# Altium footprint library PcbLib1.PcbLib: 56 footprints (part 2 of 4)
Each footprint in its own frame and in the unit in brackets; x right, y up, seen from the top. Pads: shape width x height; smd on the part's side, far side on the other; paste and mask are expansions set on the pad; w line width, h text height; cw(c..) or ccw(c..) is an arc to the next point about the centre after c.
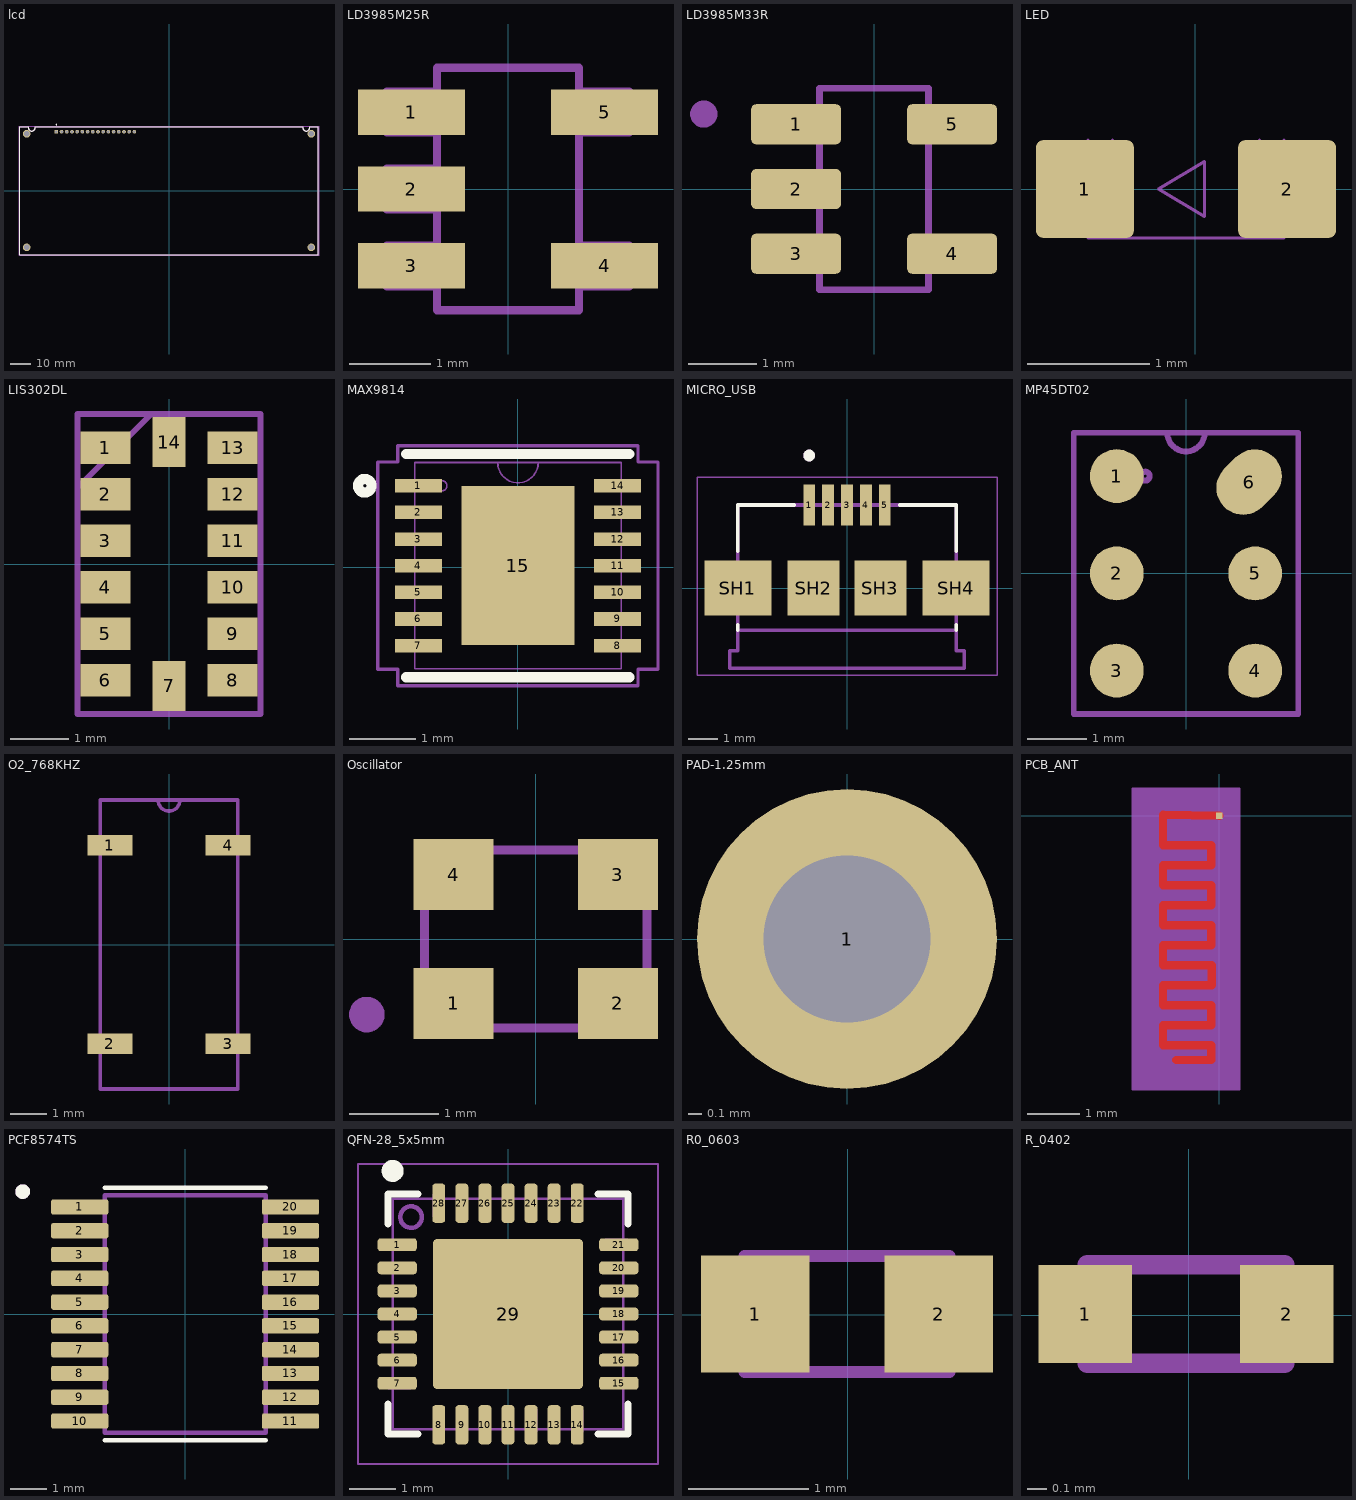
[diagram p1: the footprints below, top view; thin cyan lines are the x and y axes]

## lcd [mm]
pads (20):
  rect 1.8x1.8 / inner round 1.8 / far side rect 1.8x1.8 hole 1.2: 1(-55,28.75)
  round 1.8 hole 1.2: 2(-52.46,28.75) 3(-49.92,28.75) 4(-47.38,28.75) 5(-44.84,28.75) 6(-42.3,28.75) 7(-39.76,28.75) 8(-37.22,28.75) 9(-34.68,28.75) 10(-32.14,28.75) 11(-29.6,28.75) 12(-27.06,28.75) 13(-24.52,28.75) 14(-21.98,28.75) 15(-19.44,28.75) 16(-16.9,28.75)
  round 3.716 hole 2.7: SH1(-69.5,27.75) SH2(69.5,27.75) SH3(-69.5,-27.75) SH4(69.5,-27.75)
Top Overlay:
  circle w0.2: c-55,32.179 r0.1
  lines w0.127: -68.751,31.246 ccw(c-66.75,31) -66.996,28.999 ; -68.75,31.25 -73,31.25 -73,-31.25 73,-31.25 73,31.25 68.75,31.25 ; -67.004,28.999 ccw(c-67.25,31) -65.249,31.246 ; -65.25,31.25 65.25,31.25 ; 65.249,31.246 ccw(c67.25,31) 67.004,28.999 ; 66.996,28.999 ccw(c66.75,31) 68.751,31.246
Mechanical 13:
  circle w0.2: c-55,32.179 r0.1
  lines w0.127: -68.751,31.246 ccw(c-66.75,31) -66.996,28.999 ; -68.75,31.25 -73,31.25 -73,-31.25 73,-31.25 73,31.25 68.75,31.25 ; -67.004,28.999 ccw(c-67.25,31) -65.249,31.246 ; -65.25,31.25 65.25,31.25 ; 65.249,31.246 ccw(c67.25,31) 67.004,28.999 ; 66.996,28.999 ccw(c66.75,31) 68.751,31.246
Mechanical 15:
  lines w0.05: -73.25,-31.5 -73.25,31.5 73.25,31.5 73.25,-31.5 -73.25,-31.5
3D body "step_temp.STEP": height 26.3, standoff 11.8, extent -73,-31.25 73,31.25

## LD3985M25R [mil]
pads (5):
  rect 52x22 smd paste+0 mask+0: 1(-47,37.4) 2(-47,0) 3(-47,-37.4) 4(47,-37.4) 5(47,37.4)
Top Assembly:
  lines w3.94: -59,-47.4 -34.5,-47.4 -34.5,-27.4 -59,-27.4 -59,-47.4 ; -59,-10 -34.5,-10 -34.5,10 -59,10 -59,-10 ; -59,27.4 -34.5,27.4 -34.5,47.4 -59,47.4 -59,27.4 ; -34.5,-59 -34.5,59 34.5,59 34.5,-59 -34.5,-59 ; 34.5,-47.4 59,-47.4 59,-27.4 34.5,-27.4 34.5,-47.4 ; 34.5,27.4 59,27.4 59,47.4 34.5,47.4 34.5,27.4
Mechanical 13:
  text "*" at -37,18.4 h50
3D body "SOT23-5L_STM.step": height 57.09, standoff 0, extent -59.01,-59.01 59.02,59.02

## LD3985M33R [mm]
pads (5):
  rrect25% 1.32x0.59 smd: 1(-1.145,0.95) 2(-1.145,0) 3(-1.145,-0.95) 4(1.145,-0.95) 5(1.145,0.95)
Top Assembly:
  lines w0.1: -0.8,-1.48 -0.8,1.48 0.8,1.48 0.8,-1.48 -0.8,-1.48
Mechanical 13:
  circle w0.2: c-2.5,1.1 r0.1
3D body "step_temp.STEP": height 1.45, standoff 0, extent -1.4,-1.462 1.4,1.463

## LED [mm]
pads (2):
  rrect15% 0.8x0.8 smd mask+0.05: 1(-0.9,0) 2(0.75,0)
Top Component Center:
  lines w0.025: -0.875,-0.25 -0.675,-0.25 ; -0.875,0.25 -0.675,0.25 ; -0.875,0.4 -0.875,0.15 cw(c-0.875,0) -0.875,-0.15 -0.875,-0.4 0.725,-0.4 0.725,-0.15 cw(c0.725,0) 0.725,0.15 0.725,0.4 ; -0.675,-0.4 -0.675,0.4 ; 0.525,-0.4 0.525,0.4 ; 0.525,-0.15 ccw(c0.725,0) 0.725,-0.25 ; 0.525,0.15 cw(c0.725,0) 0.725,0.25 ; -0.3,0 0.075,0.225 0.075,-0.225 -0.3,0
3D body "SML-D10.STEP": height 0.54, standoff -0.01, extent -0.875,-0.4 0.725,0.4

## LIS302DL [mil]
pads (14):
  rect 34x22 smd paste+0 mask+0: 1(-43,78.74) 2(-43,47.24) 3(-43,15.75) 4(-43,-15.75) 5(-43,-47.24) 6(-43,-78.74) 8(43,-78.74) 9(43,-47.24) 10(43,-15.75) 11(43,15.75) 12(43,47.24) 13(43,78.74)
  rect 22x34 smd paste+0 mask+0: 7(0,-82.5) 14(0,82.5)
Top Assembly:
  lines w3.94: -62,51.5 -12,101.5 ; -62,-101.5 62,-101.5 62,101.5 -62,101.5 -62,-101.5
Mechanical 13:
  text "*" at -38.5,84.49 h50
3D body "LGA-14_3x5x0p92mm_STM.step": height 39.09, standoff 0, extent -62,-101.49 62.01,101.5

## MAX9814 [mm]
pads (15):
  rect 0.706x0.204 smd paste+0 mask+0: 1(-1.496,1.225) 2(-1.496,0.825) 3(-1.496,0.425) 4(-1.496,0.025) 5(-1.496,-0.375) 6(-1.496,-0.775) 7(-1.496,-1.175) 8(1.496,-1.175) 9(1.496,-0.775) 10(1.496,-0.375) 11(1.496,0.025) 12(1.496,0.425) 13(1.496,0.825) 14(1.496,1.225)
  rect 1.702x2.388 smd paste+0 mask+0: 15(0,0.025)
Top Overlay:
  circle w0.152: c-2.3,1.225 r0.102
  lines w0.152: -1.676,-1.651 1.676,-1.651 ; -1.676,1.701 1.676,1.701
Top Assembly:
  lines w0.05: -2.103,-1.531 -2.103,1.581 -1.803,1.581 -1.803,1.828 1.803,1.828 1.803,1.581 2.103,1.581 2.103,-1.531 1.803,-1.531 1.803,-1.778 -1.803,-1.778 -1.803,-1.531 -2.103,-1.531
Mechanical 13:
  circle w0.025: c-1.143,1.225 r0.076
  lines w0.025: -0.305,1.574 ccw(c0,1.574) 0.305,1.574 ; -1.549,-1.524 -1.549,1.574 1.549,1.574 1.549,-1.524 -1.549,-1.524
3D body "21-0137I_T1433-2_MXM.step": height 0.81, standoff 0, extent -1.549,-1.524 1.549,1.574

## MICRO_USB [mm]
pads (9):
  rect 0.4x1.4 smd: 1(-1.3,2.85) 2(-0.65,2.85) 3(0,2.85) 4(0.65,2.85) 5(1.3,2.85)
  rect 2.3x1.9 smd: SH1(-3.75,0) SH4(3.75,0)
  rect 1.8x1.9 smd: SH2(-1.15,0) SH3(1.15,0)
Top Overlay:
  circle w0.2: c-1.3,4.55 r0.1
  lines w0.127: -3.75,-1.45 -3.75,-1.27 ; -3.75,1.27 -3.75,2.85 -1.82,2.85 ; 1.82,2.85 3.75,2.85 3.75,1.27 ; 3.75,-1.45 3.75,-1.27
Top Assembly:
  lines w0.05: -5.15,-3 -5.15,3.8 5.15,3.8 5.15,-3 -5.15,-3
Mechanical 13:
  circle w0.2: c-1.3,4.55 r0.1
  lines w0.127: -3.75,-1.45 3.75,-1.45 ; -3.75,-1.45 -3.75,-2.15 -4.03,-2.15 -4.03,-2.75 4.03,-2.75 4.03,-2.15 3.75,-2.15 3.75,-1.45 ; -3.75,-1.45 -3.75,2.85 3.75,2.85 3.75,-1.45
3D body "step_temp.STEP": height 2.79, standoff -0.24, extent -4.039,-2.705 4.039,2.859

## MP45DT02 [mil]
pads (6):
  round 36 smd paste+0 mask+0: 1(-46.26,64.96) 2(-46.26,0) 3(-46.26,-64.96) 4(46.26,-64.96) 5(46.26,0)
  oval 47x36 smd rot 45 paste-23.5 mask-23.5: 6(42.13,61.02)
Top Assembly:
  circle w3.94: c-27.26,64.96 r3
  lines w3.94: -12.5,94 ccw(c0,94) 12.5,94 ; -75,-94 75,-94 75,94 -75,94 -75,-94
3D body "MP45DT02.STEP": height 54.13, standoff 0, extent -74.01,-92.91 74.02,92.92

## O2_768KHZ [mil]
pads (4):
  rect 49x22 smd paste+0 mask+0: 1(-64.5,108.27) 2(-64.5,-108.27) 3(64.5,-108.27) 4(64.5,108.27)
Top Assembly:
  lines w3.94: -12,157.5 ccw(c0,157.5) 12,157.5 ; -75,-157.5 -75,157.5 75,157.5 75,-157.5 -75,-157.5 ; -75,-118.27 -75,-98.27 -75,-118.27 ; -75,98.27 -75,118.27 -75,98.27 ; 75,-118.27 75,-98.27 75,-118.27 ; 75,98.27 75,118.27 75,98.27
Mechanical 13:
  text "*" at -57,80.27 h50
3D body "X_ABS25_ABR.step": height 98.11, standoff -0.02, extent -75,-157.48 75,157.48

## Oscillator [mm]
pads (4):
  rect 0.9x0.8 smd: 1(-0.925,-0.725) 2(0.925,-0.725) 3(0.925,0.725) 4(-0.925,0.725)
Top Assembly:
  lines w0.1: -1.25,-1 -1.25,1 1.25,1 1.25,-1 -1.25,-1
Mechanical 13:
  circle w0.2: c-1.9,-0.85 r0.1
3D body "step_temp.STEP": height 0.9, standoff 0, extent -1.25,-1 1.25,1

## PAD-1.25mm [mm]
pads (1):
  round 2.25 hole 1.25: 1(0,0)

## PCB_ANT [mil]
pads (1):
  rect 5x5 smd: 1(0,0)
Top Layer:
  lines w6.2: -32.23,-183.23 -6,-183.23 -6,-172.27 -42.23,-172.27 -42.23,-157.27 -6,-157.27 -6,-142.27 -42.23,-142.27 -42.23,-127.27 -5.64,-127.27 -5.64,-112.27 -42.23,-112.27 -42.23,-97.27 -6,-97.27 -6,-82.27 -42.23,-82.27 -42.23,-67.27 -6,-67.27 -6,-52.27 -42.23,-52.27 -42.23,-37.27 -6,-37.27 -6,-22.27 -42.23,-22.27 -42.23,0.73 0,0
Mechanical 1:
  pour cut-out: -65,20 -65,-205 15,-205 15,20
Top Assembly:
  lines w1.97: -65,-205 15,-205 15,20 -65,20 -65,-205
Top Designator:
  text ".Designator" at -92.83,56.68 h19.68
Top Value:
  text ".Comment" at -93.82,31.09 h19.68

## PCF8574TS [mm]
pads (20):
  rrect25% 1.56x0.42 smd: 1(-2.88,2.925) 2(-2.88,2.275) 3(-2.88,1.625) 4(-2.88,0.975) 5(-2.88,0.325) 6(-2.88,-0.325) 7(-2.88,-0.975) 8(-2.88,-1.625) 9(-2.88,-2.275) 10(-2.88,-2.925) 11(2.88,-2.925) 12(2.88,-2.275) 13(2.88,-1.625) 14(2.88,-0.975) 15(2.88,-0.325) 16(2.88,0.325) 17(2.88,0.975) 18(2.88,1.625) 19(2.88,2.275) 20(2.88,2.925)
Top Overlay:
  circle w0.2: c-4.44,3.345 r0.1
  lines w0.127: -2.2,-3.455 2.2,-3.455 ; -2.2,3.455 2.2,3.455
Mechanical 13:
  circle w0.2: c-4.44,3.345 r0.1
  lines w0.127: -2.2,-3.25 -2.2,3.25 2.2,3.25 2.2,-3.25 -2.2,-3.25
3D body "step_temp.STEP": height 1.5, standoff 0, extent -3.2,-3.25 3.2,3.25

## QFN-28_5x5mm [mm]
height 0.9
pads (29):
  rrect50% 0.85x0.28 smd mask+0.05: 1(-2.4,1.5) 2(-2.4,1) 3(-2.4,0.5) 4(-2.4,0) 5(-2.4,-0.5) 6(-2.4,-1) 7(-2.4,-1.5) 15(2.4,-1.5) 16(2.4,-1) 17(2.4,-0.5) 18(2.4,0) 19(2.4,0.5) 20(2.4,1) 21(2.4,1.5)
  rrect50% 0.28x0.85 smd mask+0.05: 8(-1.5,-2.4) 9(-1,-2.4) 10(-0.5,-2.4) 11(0,-2.4) 12(0.5,-2.4) 13(1,-2.4) 14(1.5,-2.4) 22(1.5,2.4) 23(1,2.4) 24(0.5,2.4) 25(0,2.4) 26(-0.5,2.4) 27(-1,2.4) 28(-1.5,2.4)
  rrect5% 3.25x3.25 smd paste-1.65 mask+0.05: 29(0,0)
Top Overlay:
  circle w0.254: c-2.5,3.1 r0.112
  lines w0.15: -2.6,-1.95 -2.6,-2.6 -1.95,-2.6 ; -2.6,1.95 -2.6,2.6 -1.95,2.6 ; 1.95,-2.6 2.6,-2.6 2.6,-1.95 ; 1.95,2.6 2.6,2.6 2.6,1.95
Top Paste:
  rectangle: 0.075,-1.525 1.525,-0.075
  rectangle: 0.075,0.075 1.525,1.525
  rectangle: -1.525,-1.525 -0.075,-0.075
  rectangle: -1.525,0.075 -0.075,1.525
Top Assembly:
  circle w0.1: c-2.1,2.1 r0.234
  rectangle: -2.595,1.378 -2.095,1.628
  rectangle: -2.595,0.874 -2.095,1.124
  rectangle: -2.601,0.382 -2.101,0.632
  rectangle: -2.589,-0.125 -2.089,0.125
  rectangle: -2.589,-0.63 -2.089,-0.38
  rectangle: -2.595,-1.122 -2.095,-0.872
  rectangle: -2.6,-1.634 -2.1,-1.384
  region: -1.371,-2.56 -1.371,-2.06 -1.621,-2.06 -1.621,-2.56
  region: -0.867,-2.56 -0.867,-2.06 -1.117,-2.06 -1.117,-2.56
  region: -0.375,-2.565 -0.375,-2.065 -0.625,-2.065 -0.625,-2.565
  region: 0.132,-2.554 0.132,-2.054 -0.118,-2.054 -0.118,-2.554
  region: 0.637,-2.554 0.637,-2.054 0.387,-2.054 0.387,-2.554
  region: 1.129,-2.559 1.129,-2.059 0.879,-2.059 0.879,-2.559
  region: 1.641,-2.565 1.641,-2.065 1.391,-2.065 1.391,-2.565
  region: 2.598,-1.377 2.098,-1.377 2.098,-1.627 2.598,-1.627
  region: 2.598,-0.873 2.098,-0.873 2.098,-1.123 2.598,-1.123
  region: 2.603,-0.381 2.103,-0.381 2.103,-0.631 2.603,-0.631
  region: 2.592,0.126 2.092,0.126 2.092,-0.124 2.592,-0.124
  region: 2.592,0.63 2.092,0.63 2.092,0.38 2.592,0.38
  region: 2.597,1.123 2.097,1.123 2.097,0.873 2.597,0.873
  region: 2.603,1.635 2.103,1.635 2.103,1.385 2.603,1.385
  region: 1.378,2.595 1.378,2.095 1.628,2.095 1.628,2.595
  region: 0.874,2.595 0.874,2.095 1.124,2.095 1.124,2.595
  region: 0.381,2.6 0.381,2.1 0.631,2.1 0.631,2.6
  region: -0.126,2.589 -0.126,2.089 0.124,2.089 0.124,2.589
  region: -0.63,2.589 -0.63,2.089 -0.38,2.089 -0.38,2.589
  region: -1.122,2.594 -1.122,2.094 -0.872,2.094 -0.872,2.594
  region: -1.634,2.599 -1.634,2.099 -1.384,2.099 -1.384,2.599
  lines w0.05: -2.5,-2.5 -2.5,2.5 2.5,2.5 2.5,-2.5 -2.5,-2.5
Top Courtyard:
  lines w0.05: -3.25,-3.25 3.25,-3.25 3.25,3.25 -3.25,3.25 -3.25,-3.25
  lines w0.1: -0.5,0 0.5,0 ; 0,-0.5 0,0.5
Top Designator:
  text ".Designator" at -1.7,4.05 h0.5
Top Value:
  text ".Comment" at -1.681,3.381 h0.5
3D body "QFN-28.STEP": height 1, standoff 0, extent -2.5,-2.5 2.5,2.5

## R0_0603 [mm]
pads (2):
  rect 0.9x0.97 smd: 1(-0.765,0.007) 2(0.755,0.007)
Top Assembly:
  lines w0.1: -0.855,-0.473 0.845,-0.473 0.845,0.487 -0.855,0.487 -0.855,-0.473
3D body "step_temp.STEP": height 0.55, standoff 0, extent -0.78,-0.393 0.77,0.407

## R_0402 [mm]
pads (2):
  rect 0.475x0.5 smd: 1(-0.525,0.006) 2(0.499,0.006)
Top Assembly:
  lines w0.1: -0.513,-0.244 0.487,-0.244 0.487,0.256 -0.513,0.256 -0.513,-0.244
3D body "step_temp.STEP": height 0.35, standoff 0, extent -0.513,-0.244 0.487,0.256